# Altium footprint library custom.PcbLib: 305 footprints (part 15 of 20)
Each footprint in its own frame and in the unit in brackets; x right, y up, seen from the top. Pads: shape width x height; smd on the part's side, far side on the other; paste and mask are expansions set on the pad; w line width, h text height; cw(c..) or ccw(c..) is an arc to the next point about the centre after c.
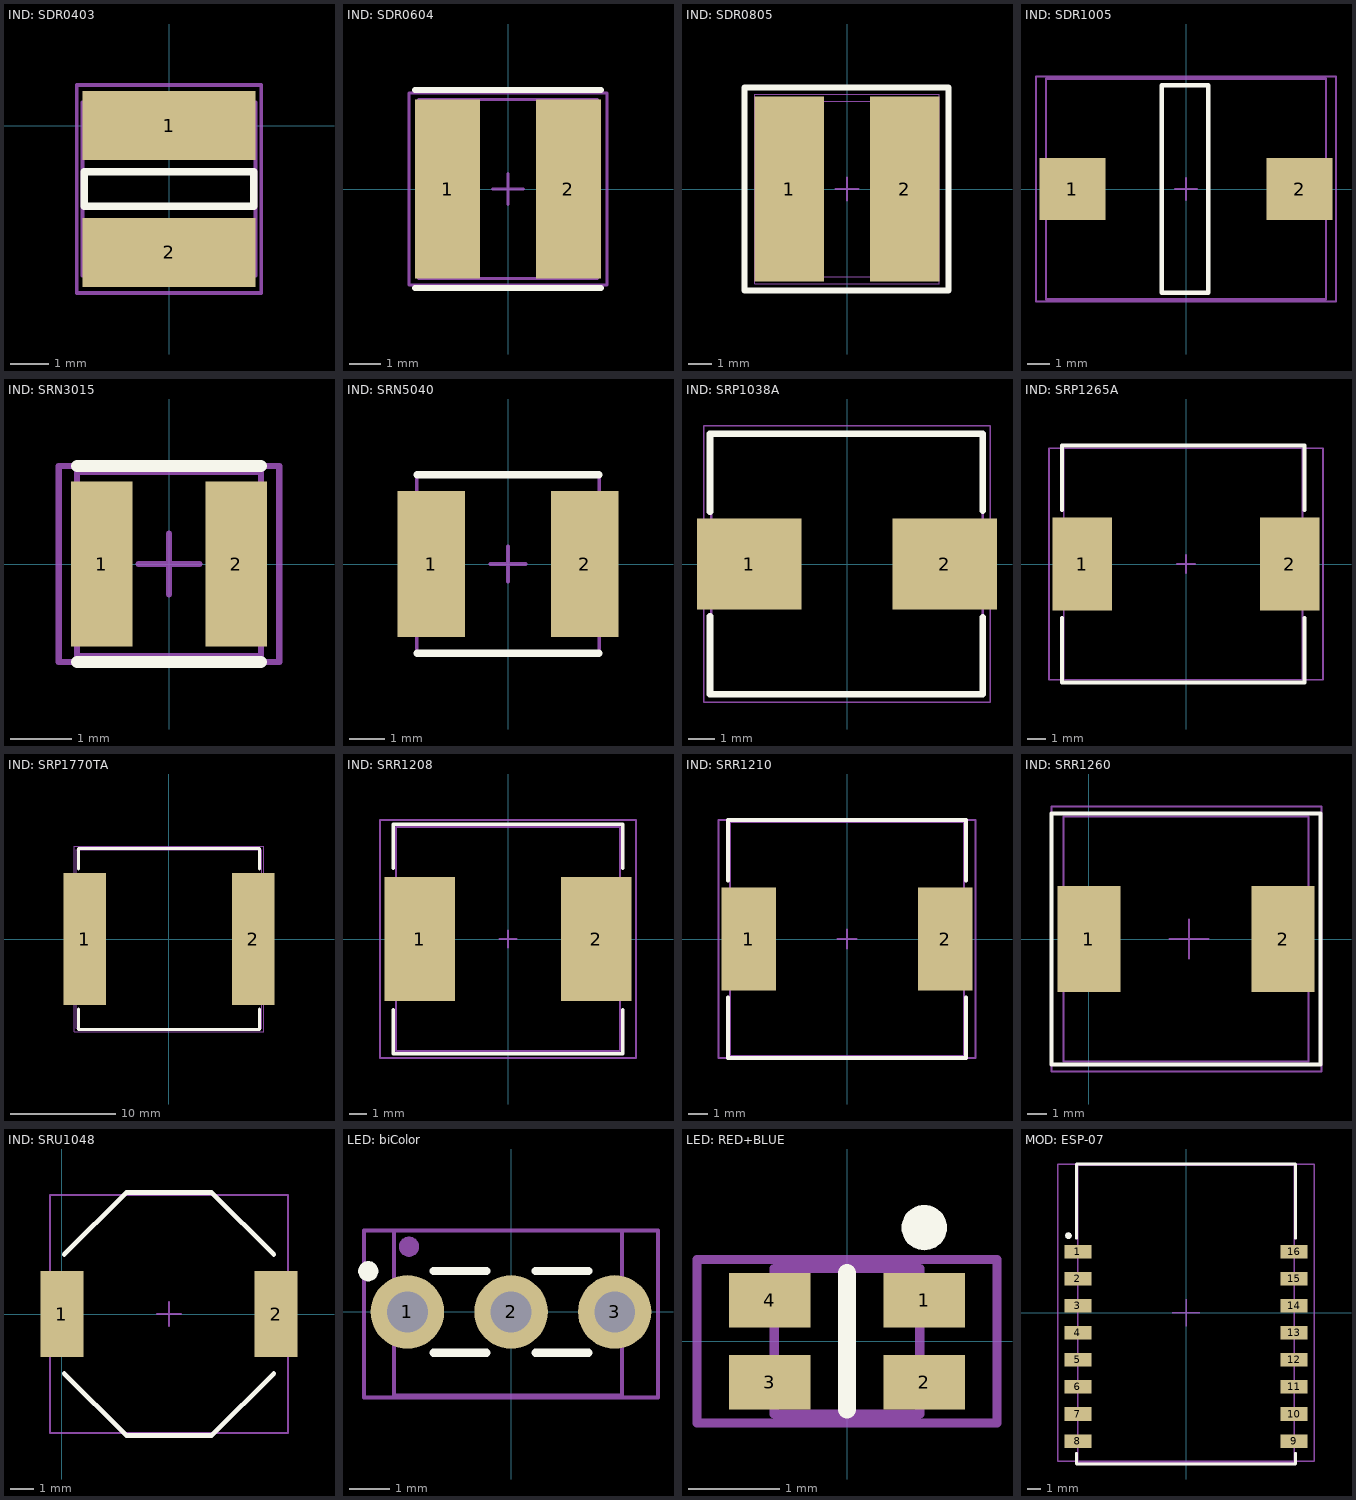
[diagram p14: the footprints below, top view; thin cyan lines are the x and y axes]

## IND: SDR0403 [mm]
pads (2):
  rect 4.5x1.8 smd: 1(0,0) 2(0,-3.3)
Top Overlay:
  lines w0.2: -2.2,-2.1 2.2,-2.1 2.2,-1.2 -2.2,-1.2 -2.2,-2.1
Top Assy:
  lines w0.1: -2.25,-3.9 -2.25,0.25 -2.25,0.6 2.25,0.6 2.25,-3.9 -2.25,-3.9
Size Area:
  lines w0.1: -2.4,-4.35 2.4,-4.35 2.4,1.05 -2.4,1.05 -2.4,-4.35
3D body "User Library-SDR0403.STEP": height 3.5, standoff 0, extent -2.25,-3.9 2.25,0.6

## IND: SDR0604 [mm]
pads (2):
  rect 2.1x5.8 smd: 1(-1.95,0) 2(1.95,0)
Top Overlay:
  lines w0.2: -3,-3.2 3,-3.2 ; -3,3.2 3,3.2
Top Assy:
  lines w0.1: -2.9,-2.9 -2.9,2.9 2.9,2.9 2.9,-2.9 -2.9,-2.9
Size Area:
  lines w0.1: -0.5,0 0.5,0 ; 0,-0.5 0,0.5 ; -3.2,-3.1 -3.2,3.1 3.2,3.1 3.2,-3.1 -3.2,-3.1
3D body "SDR0604.STEP": height 4.8, standoff 0, extent -2.9,-2.9 2.9,2.9

## IND: SDR0805 [mm]
height 5.3
pads (2):
  rect 3x8 smd: 1(-2.5,0) 2(2.5,0)
Top Overlay:
  lines w0.254: -4.445,-4.4 4.4,-4.4 4.4,4.4 -4.445,4.4 -4.445,-4.4
Top Assy:
  lines w0.05: -3.7,-3.8 3.7,-3.8 3.7,3.8 -3.7,3.8 -3.7,-3.8
Size Area:
  lines w0.05: -4,-4.1 -4,4.1 4,4.1 4,-4.1 -4,-4.1
  lines w0.1: -0.5,0 0.5,0 ; 0,-0.5 0,0.5
3D body "SDR0805.STEP": height 5.08, standoff 0.03, extent -3.677,-3.75 3.677,3.75

## IND: SDR1005 [mm]
pads (2):
  rect 3x2.8 smd: 1(-5.15,0) 2(5.15,0)
Top Overlay:
  lines w0.2: -1.1,-4.7 1,-4.7 1,4.7 -1.1,4.7 -1.1,-4.7
Top Assy:
  lines w0.1: -6.35,-5 -6.35,5 6.35,5 6.35,-5 -6.35,-5
Size Area:
  lines w0.1: -0.5,0 0.5,0 ; 0,-0.5 0,0.5 ; -6.8,-5.1 6.8,-5.1 6.8,5.1 -6.8,5.1 -6.8,-5.1
3D body "Деталь2.STEP": height 5.1, standoff 0.1, extent -6.35,-5 6.35,5

## IND: SRN3015 [mm]
pads (2):
  rect 1x2.7 smd: 1(-1.1,0) 2(1.1,0)
Top Overlay:
  lines w0.2: -1.5,-1.6 1.5,-1.6 ; -1.5,1.6 1.5,1.6
Top Assy:
  lines w0.1: -1.5,-1.5 -1.5,-1.5 ; -1.5,-1.5 -1.5,1.5 1.5,1.5 1.5,-1.5 -1.5,-1.5
Size Area:
  lines w0.1: -0.5,0 0.5,0 ; 0,-0.5 0,0.5 ; -1.8,-1.6 -1.8,1.6 1.8,1.6 1.8,-1.6 -1.8,-1.6
3D body "srn3015.stp": height 1.5, standoff 0, extent -1.5,-1.5 1.5,1.5

## IND: SRN5040 [mm] "Precision Wire Wound Inductor, 2-Leads, Body 5,00x5,00mm, SRN5040 Series"
height 4
pads (2):
  rect 1.9x4.1 smd: 1(-2.15,0) 2(2.15,0)
Top Overlay:
  lines w0.2: -2.55,-2.5 2.55,-2.5 ; -2.55,2.5 2.55,2.5
Top Assy:
  lines w0.1: -2.55,-2.5 -2.55,2.5 2.55,2.5 2.55,-2.5 -2.55,-2.5
Size Area:
  lines w0.1: -0.5,0 0.5,0 ; 0,-0.5 0,0.5
3D body "User Library-SRN5040.step": height 4, standoff 0, extent -2.5,-2.5 2.5,2.5

## IND: SRP1038A [mm] "SMT inductor, 11x10x3.8 mm Bourns"
height 3.8
pads (2):
  rect 4x3.5 smd: 1(-3.75,0) 2(3.75,0)
Top Overlay:
  lines w0.254: -5.25,-2 -5.25,-5 5.2,-5 5.2,-2.05 ; -5.25,2 -5.25,5 5.2,5 5.2,2.05
Top Assy:
  lines w0.1: -5.2,-5 5.2,-5 5.2,5 -5.2,5 -5.2,-5
Size Area:
  lines w0.05: -5.5,-5.3 5.5,-5.3 5.5,5.3 -5.5,5.3 -5.5,-5.3
3D body "SRP 1038A.STEP": height 3.8, standoff 0.05, extent -5.2,-5 5.2,5

## IND: SRP1265A [mm]
pads (2):
  rect 3.2x5 smd: 1(-5.6,0) 2(5.6,0)
Top Overlay:
  lines w0.2: -6.7,-2.9 -6.7,-6.4 6.4,-6.4 6.4,-2.9 ; -6.7,2.9 -6.7,6.4 6.4,6.4 6.4,2.9
Top Assy:
  lines w0.1: -6.6,-6.25 -6.6,6.25 6.3,6.25 6.3,-6.25 -6.6,-6.25
Size Area:
  lines w0.1: -0.5,0 0.5,0 ; 0,-0.5 0,0.5 ; -7.4,-6.25 -7.4,6.25 7.4,6.25 7.4,-6.25 -7.4,-6.25
3D body "SRP1265A series.stp": height 6.31, standoff 0, extent -6.6,-6.25 6.3,6.25

## IND: SRP1770TA [mm] "SMD inductor, 17x17x7 mm"
height 7
pads (2):
  rect 4x12.5 smd: 1(-8,0) 2(8,0)
Top Overlay:
  lines w0.254: -8.6,-6.65 -8.6,-8.6 8.6,-8.6 8.6,-6.65 ; -8.6,6.65 -8.6,8.6 8.6,8.6 8.6,6.65
Top Assy:
  lines w0.1: -8.8,-8.5 8.8,-8.5 8.8,8.5 -8.8,8.5 -8.8,-8.5
Size Area:
  lines w0.05: -9,-8.8 9,-8.8 9,8.8 -9,8.8 -9,-8.8
3D body "SRP1770TA.stp": height 6.81, standoff 0, extent -8.85,-8.5 9.05,8.4

## IND: SRR1208 [mm]
pads (2):
  rect 4x7 smd: 1(-5,0) 2(5,0)
Top Overlay:
  lines w0.2: -6.5,-4 -6.5,-6.5 6.5,-6.5 6.5,-4 ; -6.5,4 -6.5,6.5 6.5,6.5 6.5,4
Top Assy:
  lines w0.1: -6.35,-6.35 -6.35,6.35 6.35,6.35 6.35,-6.35 -6.35,-6.35
Size Area:
  lines w0.1: -0.5,0 0.5,0 ; 0,-0.5 0,0.5 ; -7.25,-6.75 7.25,-6.75 7.25,6.75 -7.25,6.75 -7.25,-6.75
3D body "User Library-SRR1208.STEP": height 8.5, standoff 0.01, extent -6.35,-6.35 6.35,6.35

## IND: SRR1210 [mm]
pads (2):
  rect 2.8x5.3 smd: 1(-5.05,0) 2(5.05,0)
Top Overlay:
  lines w0.2: -6.1,-3 -6.1,-6.1 6.1,-6.1 6.1,-3 ; -6.1,3 -6.1,6.1 6.1,6.1 6.1,3
Top Assy:
  lines w0.1: -6,-6 -6,6 6,6 6,-6 -6,-6
Size Area:
  lines w0.1: -0.5,0 0.5,0 ; 0,-0.5 0,0.5 ; -6.6,-6.1 6.6,-6.1 6.6,6.1 -6.6,6.1 -6.6,-6.1
3D body "User Library-SRR1210_inductor.STEP": height 10.37, standoff 0.01, extent -6,-6 6,6

## IND: SRR1260 [mm]
pads (2):
  rect 3.2x5.4 smd: 1(0,0) 2(9.9,0)
Top Overlay:
  lines w0.2: -1.9,-6.4 11.8,-6.4 11.8,6.4 -1.9,6.4 -1.9,-6.4
Top Assy:
  lines w0.1: -1.3,-6.25 -1.3,6.25 11.2,6.25 11.2,-6.25 -1.3,-6.25
Size Area:
  lines w0.1: 4.1,0 6.1,0 ; 5.1,-1 5.1,1 ; -1.9,-6.75 -1.9,6.75 11.85,6.75 11.85,-6.75 -1.9,-6.75
3D body "SW3dPS-DRQ127_12.5x12.5.STEP": height 8, standoff 0, extent -1.3,-6.25 11.2,6.25

## IND: SRU1048 [mm]
pads (2):
  rect 1.8x3.6 smd: 1(0,0) 2(9,0)
Top Overlay:
  lines w0.2: 0.1,-2.5 2.7,-5.1 6.3,-5.1 8.9,-2.5 ; 0.1,2.5 2.7,5.1 6.3,5.1 8.9,2.5
Top Assy:
  lines w0.1: -0.5,-5 -0.5,5 9.5,5 9.5,-5 -0.5,-5
Size Area:
  lines w0.1: 4,0 5,0 ; 4.5,-0.5 4.5,0.5 ; -0.5,-5 -0.5,5 9.5,5 9.5,-5 -0.5,-5
3D body "sru1048.stp": height 4.82, standoff 0, extent -0.5,-5 9.5,5

## LED: biColor [mm]
pads (5):
  round 1.8 hole 1: 1(-2.54,0) 2(0,0) 3(2.54,0)
  round 0.5 on Top Overlay: ""(-3.5,1)
  round 0.5 on Mech1: ""(-2.5,1.6)
Top Overlay:
  lines w0.2: -1.9,-1 -0.6,-1 ; -1.9,1 -0.6,1 ; 0.6,-1 1.9,-1 ; 0.6,1 1.9,1
Top Assy:
  lines w0.1: -2.869,-2.05 -2.869,1.998 2.719,1.998 2.719,-2.05 -2.869,-2.05
Size Area:
  lines w0.1: -0.5,0 0.5,0 ; 0,-0.5 0,0.5 ; -3.6,-2.1 3.6,-2.1 3.6,2 -3.6,2 -3.6,-2.1
3D body "biLED.STEP": height 10.21, standoff -2.75, extent -2.869,-2.05 2.719,1.998

## LED: RED+BLUE [mm]
pads (5):
  rect 0.9x0.6 smd: 1(0.85,0.45) 2(0.85,-0.45) 3(-0.85,-0.45) 4(-0.85,0.45)
  round 0.5 on Top Overlay: ""(0.85,1.25)
Top Overlay:
  lines w0.2: 0,-0.75 0,0.75
Top Assy:
  lines w0.1: -0.8,0.8 0.8,0.8 ; -0.8,0.8 -0.8,-0.8 0.8,-0.8 ; -0.8,0.8 -0.8,0.8 ; 0.8,-0.8 0.8,0.8 ; 0.8,-0.8 0.8,-0.8 ; 0.8,0.8 0.8,0.8
Size Area:
  lines w0.1: -1.65,-0.9 1.65,-0.9 1.65,0.9 -1.65,0.9 -1.65,-0.9
3D body "User Library-LED_0603_R.STEP": height 0.55, standoff -0.05, extent -0.8,0 0.8,0.8
3D body "User Library-LED_0603_B.STEP": height 0.55, standoff -0.05, extent -0.8,-0.8 0.8,0

## MOD: ESP-07 [mm]
pads (17):
  rect 2x1 smd: 1(-8,4.5) 2(-8,2.5) 3(-8,0.5) 4(-8,-1.5) 5(-8,-3.5) 6(-8,-5.5) 7(-8,-7.5) 8(-8,-9.5) 9(8,-9.5) 10(8,-7.5) 11(8,-5.5) 12(8,-3.5) 13(8,-1.5) 14(8,0.5) 15(8,2.5) 16(8,4.5)
  round 0.5 on Top Overlay: ""(-8.7,5.7)
Top Overlay:
  lines w0.2: -8.1,-10.4 -8.1,-11.2 8.1,-11.2 8.1,-10.4 ; -8.1,5.5 -8.1,10.9 -8.1,11 8.1,11 8.1,5.5
Top Assy:
  lines w0.1: -8,-11.1 8,-11.1 8,10.9 -8,10.9 -8,-11.1
Size Area:
  lines w0.1: -1,0 1,0 ; 0,-1 0,1 ; -9.5,-11 -9.5,11 9.5,11 9.5,-11 -9.5,-11
3D body "User Library-ESP07-1.STEP": height 3.5, standoff -0.01, extent -8,-11.1 8,10.9